# Altium footprint library Connectors.PcbLib: 245 footprints (part 16 of 16)
Each footprint in its own frame and in the unit in brackets; x right, y up, seen from the top. Pads: shape width x height; smd on the part's side, far side on the other; paste and mask are expansions set on the pad; w line width, h text height; cw(c..) or ccw(c..) is an arc to the next point about the centre after c.
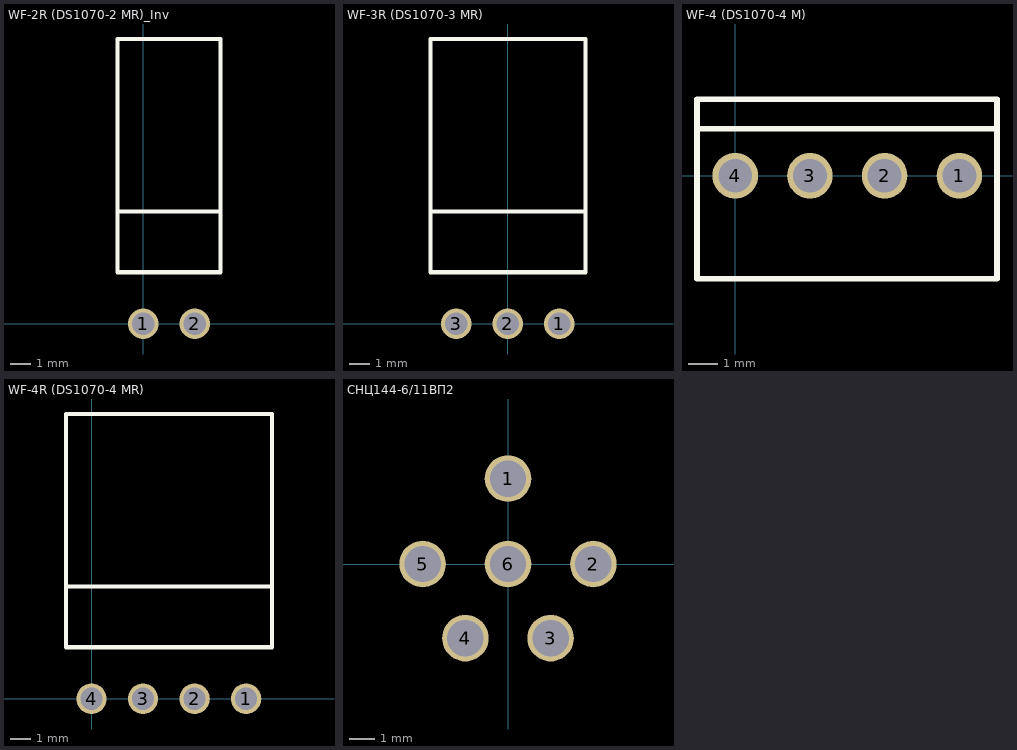
[diagram p15: the footprints below, top view; thin cyan lines are the x and y axes]

## WF-2R (DS1070-2 MR)_Inv [mm]
pads (2):
  round 1.5 hole 1.1: 1(0,0) 2(2.54,0)
Top Overlay:
  lines w0.2: -1.26,11.5 -1.26,2.54 -1.26,14.04 3.8,14.04 3.8,11.49 3.8,2.54 ; -1.25,5.54 3.79,5.54 ; -1.23,2.54 3.79,2.54
3D body "WF-2R.step": height 5.85, standoff -2.63, extent -1.27,-0.268 3.81,12.932

## WF-3R (DS1070-3 MR) [mm]
pads (3):
  round 1.5 hole 1.1: 1(2.54,0) 2(0,0) 3(-2.54,0)
Top Overlay:
  lines w0.2: -3.8,11.5 -3.8,2.54 ; -3.795,5.54 3.82,5.54 ; -3.8,2.54 3.82,2.54 3.82,11.49 3.82,14.04 -3.8,14.04 -3.8,2.54

## WF-4 (DS1070-4 M) [mm]
pads (4):
  round 1.55 hole 1.15: 1(7.62,0) 2(5.08,0) 3(2.54,0) 4(0,0)
Top Overlay:
  lines w0.2: -1.3,1.6 8.9,1.6 ; -1.3,-3.5 -1.3,2.6 8.9,2.6 8.9,-3.5 -1.3,-3.5
3D body "User Library-WF-4(1).step": height 11.83, standoff -2.45, extent -1.28,-3.2 8.88,2.7

## WF-4R (DS1070-4 MR) [mm]
pads (4):
  round 1.5 hole 1.1: 1(7.62,0) 2(5.08,0) 3(2.54,0) 4(0,0)
Top Overlay:
  lines w0.2: -1.26,11.5 -1.26,2.54 -1.26,14.04 8.9,14.04 8.9,11.49 8.9,2.54 -1.23,2.54 ; -1.25,5.54 8.9,5.54
3D body "User Library-DS1070-4MR (WF-4RA CONNFLY).step": height 5.9, standoff -3.4, extent -1.27,-0.32 8.89,13.78

## СНЦ144-6/11ВП2 [mm]
pads (6):
  round 1.8 hole 1.4: 1(0,3.3) 2(3.3,0) 3(1.65,-2.87) 4(-1.65,-2.87) 5(-3.3,0) 6(0,0)
Bottom Overlay:
  circle w0.254: c0,0 r5.801
3D body "SNC144.step": height 5.19, standoff -33.13, extent -13.1,-13.1 13.1,13.1